# Altium footprint library PCB_IntegratedCircuit.PcbLib: 75 footprints (part 4 of 5)
Each footprint in its own frame and in the unit in brackets; x right, y up, seen from the top. Pads: shape width x height; smd on the part's side, far side on the other; paste and mask are expansions set on the pad; w line width, h text height; cw(c..) or ccw(c..) is an arc to the next point about the centre after c.
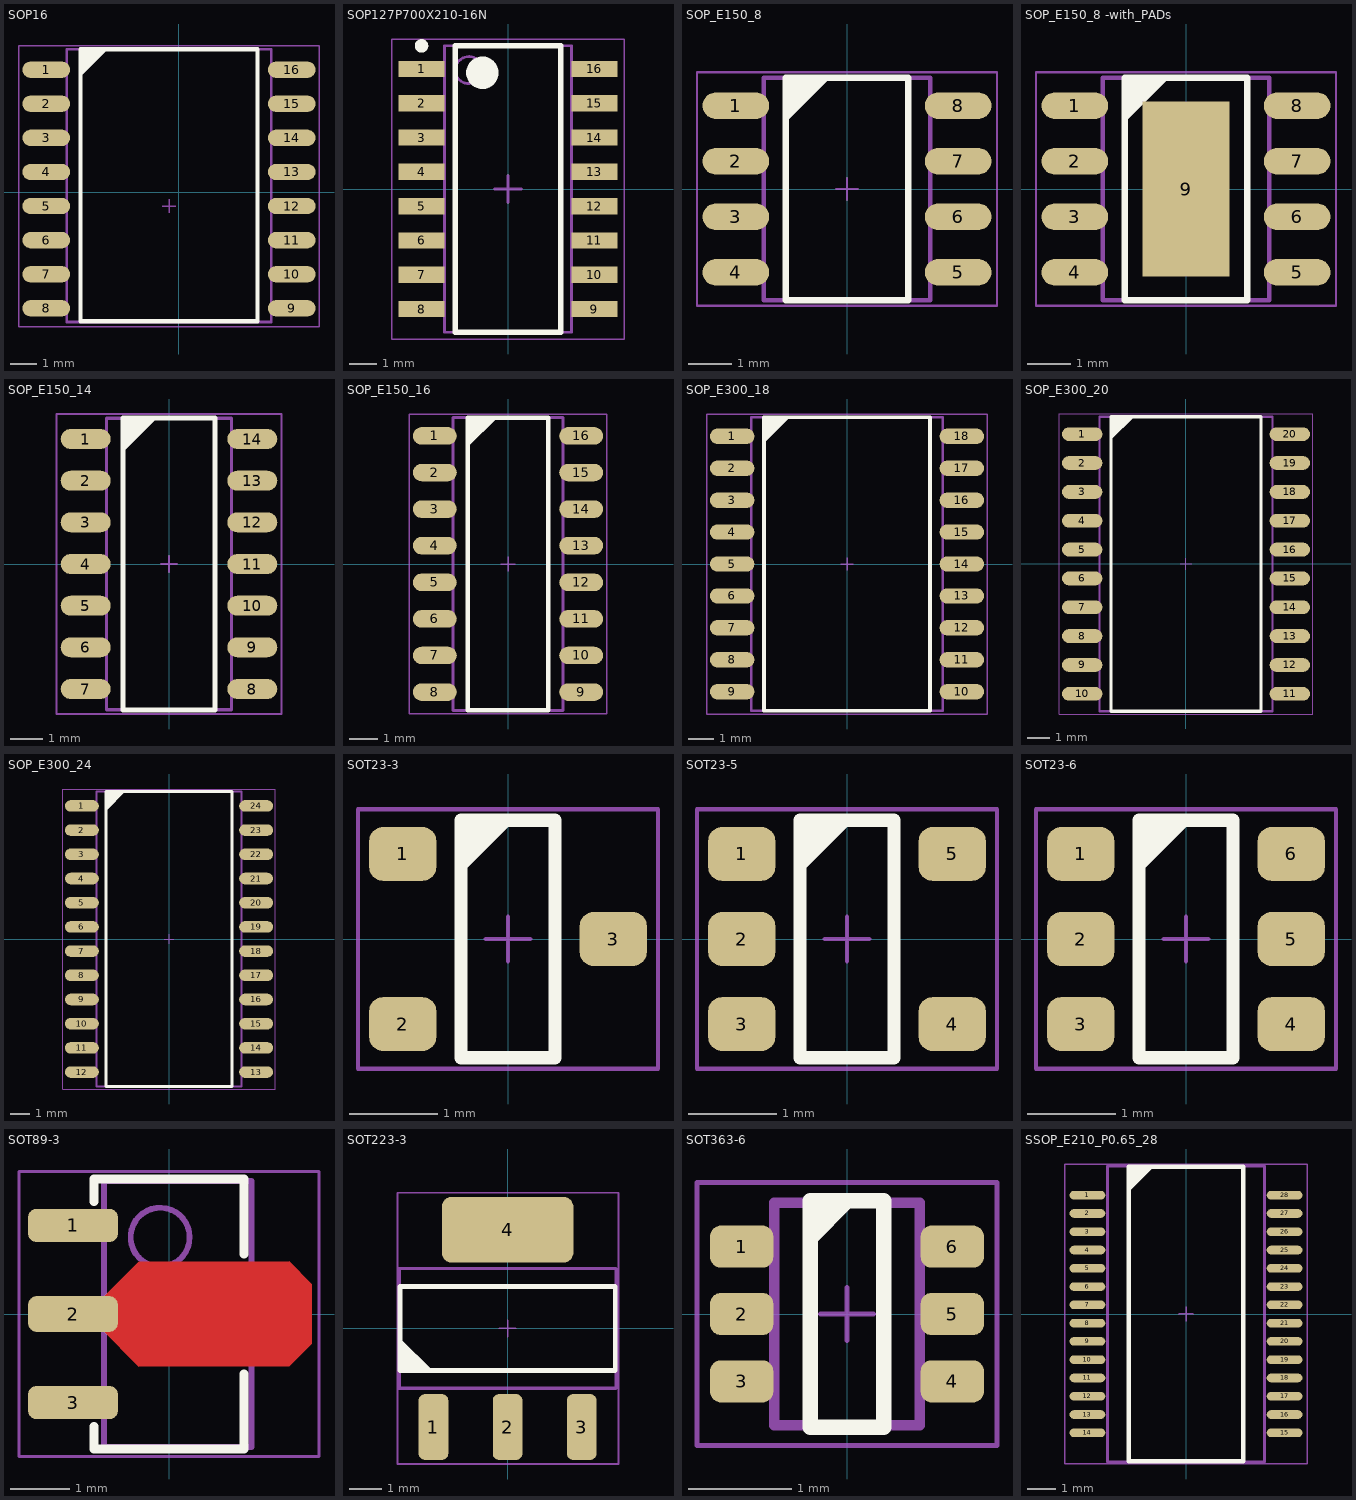
[diagram p3: the footprints below, top view; thin cyan lines are the x and y axes]

## SOP16 [mil]
pads (16):
  oval 70x24 smd: 1(-194,180) 2(-194,130) 3(-194,80) 4(-194,30) 5(-194,-20) 6(-194,-70) 7(-194,-120) 8(-194,-170) 9(166,-170) 10(166,-120) 11(166,-70) 12(166,-20) 13(166,30) 14(166,80) 15(166,130) 16(166,180)
Top Overlay:
  region: -144,210 -104,210 -144,170
  lines w6: -144,-189 -144,210 116,210 116,-189 -144,-189
Mechanical 13:
  lines w2: -24,-20 -4,-20 ; -14,-30 -14,-10
  lines w4: -164,-190 -164,210 136,210 136,-190 -164,-190
T-Component:
  lines w2: -234,-197 206,-197 206,215 -234,215 -234,-197
3D body "User Library-SOP16_208mil (5_3mm).STEP": height 70.87, standoff -7.87, extent -172.92,-195.78 138.93,205.79

## SOP127P700X210-16N [mm] "SOP, 16-Leads, Body 10.35x4.55mm, Pitch 1.27mm, IPC Medium Density"
height 2.1
pads (16):
  rect 1.7x0.6 smd: 1(-3.2,4.445) 2(-3.2,3.175) 3(-3.2,1.905) 4(-3.2,0.635) 5(-3.2,-0.635) 6(-3.2,-1.905) 7(-3.2,-3.175) 8(-3.2,-4.445) 9(3.2,-4.445) 10(3.2,-3.175) 11(3.2,-1.905) 12(3.2,-0.635) 13(3.2,0.635) 14(3.2,1.905) 15(3.2,3.175) 16(3.2,4.445)
Top Overlay:
  circle w0.6: c-0.95,4.3 r0.3
  circle w0.25: c-3.2,5.295 r0.125
  lines w0.2: -1.95,-5.3 1.95,-5.3 1.95,5.3 -1.95,5.3 -1.95,-5.3
Mechanical 13:
  circle w0.1: c-1.45,4.4 r0.5
  lines w0.1: -2.35,-5.3 2.35,-5.3 2.35,5.3 -2.35,5.3 -2.35,-5.3
B-Component:
  lines w0.05: -4.3,-5.55 4.3,-5.55 4.3,5.55 -4.3,5.55 -4.3,-5.55
  lines w0.1: -0.5,0 0.5,0 ; 0,-0.5 0,0.5
3D body "SOP127P700X210-16N.step": height 2.1, standoff 0, extent -3.5,-5.3 3.5,5.3

## SOP_E150_8 [mil]
height 68.9
pads (8):
  oval 60x24 smd: 1(-100,75) 2(-100,25) 3(-100,-25) 4(-100,-75) 5(100,-75) 6(100,-25) 7(100,25) 8(100,75)
Top Overlay:
  region: -55,100 -15,100 -55,60
  lines w6: -55,-100 55,-100 55,100 -55,100 -55,-100
Mechanical 13:
  lines w2: -10,0 10,0 ; 0,-10 0,10
  lines w4: -75,-100 -75,100 75,100 75,-100 -75,-100
T-Component:
  lines w2: -135,-105 135,-105 135,105 -135,105 -135,-105
3D body "User Library-SOIC-8-1.STEP": height 68.9, standoff 0, extent -118.1,-96.46 118.12,96.46

## SOP_E150_8 -with_PADs [mil]
height 68.9
pads (9):
  oval 60x24 smd: 1(-100,75) 2(-100,25) 3(-100,-25) 4(-100,-75) 5(100,-75) 6(100,-25) 7(100,25) 8(100,75)
  rect 78.74x157.48 smd: 9(0,0)
Top Overlay:
  region: -55,100 -15,100 -55,60
  lines w6: -55,-100 55,-100 55,100 -55,100 -55,-100
Mechanical 13:
  lines w2: -10,0 10,0 ; 0,-10 0,10
  lines w4: -75,-100 -75,100 75,100 75,-100 -75,-100
T-Component:
  lines w2: -135,-105 135,-105 135,105 -135,105 -135,-105
3D body "User Library-SOIC-8-1.STEP": height 68.9, standoff 0, extent -118.1,-96.46 118.12,96.46

## SOP_E150_14 [mil]
height 68.9
pads (14):
  oval 60x24 smd: 1(-100,150) 2(-100,100) 3(-100,50) 4(-100,0) 5(-100,-50) 6(-100,-100) 7(-100,-150) 8(100,-150) 9(100,-100) 10(100,-50) 11(100,0) 12(100,50) 13(100,100) 14(100,150)
Top Overlay:
  region: -55,175 -15,175 -55,135
  lines w6: -55,-175 -55,175 55,175 55,-175 -55,-175
Mechanical 13:
  lines w2: -10,0 10,0 ; 0,-10 0,10
  lines w4: -75,-175 75,-175 75,175 -75,175 -75,-175
T-Component:
  lines w2: -135,-180 -135,180 135,180 135,-180 -135,-180
3D body "User Library-SOIC-14.STEP": height 68.9, standoff 0, extent -118.1,-172.24 118.11,172.25

## SOP_E150_16 [mil]
height 68.9
pads (16):
  oval 60x24 smd: 1(-100,175) 2(-100,125) 3(-100,75) 4(-100,25) 5(-100,-25) 6(-100,-75) 7(-100,-125) 8(-100,-175) 9(100,-175) 10(100,-125) 11(100,-75) 12(100,-25) 13(100,25) 14(100,75) 15(100,125) 16(100,175)
Top Overlay:
  region: -55,200 -15,200 -55,160
  lines w6: -55,-200 -55,200 55,200 55,-200 -55,-200
Mechanical 13:
  lines w2: -10,0 10,0 ; 0,-10 0,10
  lines w4: -75,-200 75,-200 75,200 -75,200 -75,-200
T-Component:
  lines w2: -135,-205 -135,205 135,205 135,-205 -135,-205
3D body "User Library-SOIC-16-2.STEP": height 68.9, standoff 0, extent -118.1,-196.85 118.11,196.85

## SOP_E300_18 [mil]
height 104.33
pads (18):
  oval 70x24 smd: 1(-180,200) 2(-180,150) 3(-180,100) 4(-180,50) 5(-180,0) 6(-180,-50) 7(-180,-100) 8(-180,-150) 9(-180,-200) 10(180,-200) 11(180,-150) 12(180,-100) 13(180,-50) 14(180,0) 15(180,50) 16(180,100) 17(180,150) 18(180,200)
Top Overlay:
  region: -130,230 -90,230 -130,190
  lines w6: -130,-230 130,-230 130,230 -130,230 -130,-230
Mechanical 13:
  lines w2: -10,0 10,0 ; 0,-10 0,10
  lines w4: -150,-230 150,-230 150,230 -150,230 -150,-230
T-Component:
  lines w2: -220,-235 -220,235 220,235 220,-235 -220,-235
3D body "User Library-SOIC-18-300.STEP": height 101.26, standoff -1.1, extent -208.66,-231.29 208.66,231.31

## SOP_E300_20 [mil]
height 104.33
pads (20):
  oval 70x24 smd: 1(-180,225) 2(-180,175) 3(-180,125) 4(-180,75) 5(-180,25) 6(-180,-25) 7(-180,-75) 8(-180,-125) 9(-180,-175) 10(-180,-225) 11(180,-225) 12(180,-175) 13(180,-125) 14(180,-75) 15(180,-25) 16(180,25) 17(180,75) 18(180,125) 19(180,175) 20(180,225)
Top Overlay:
  region: -130,255 -90,255 -130,215
  lines w6: -130,-255 130,-255 130,255 -130,255 -130,-255
Mechanical 13:
  lines w2: -10,0 10,0 ; 0,-10 0,10
  lines w4: -150,-255 150,-255 150,255 -150,255 -150,-255
T-Component:
  lines w2: -220,-260 -220,260 220,260 220,-260 -220,-260
3D body "User Library-SOIC-20-300.STEP": height 101.26, standoff -1.1, extent -208.66,-255.9 208.66,255.91

## SOP_E300_24 [mil]
height 104.33
pads (24):
  oval 70x24 smd: 1(-180,275) 2(-180,225) 3(-180,175) 4(-180,125) 5(-180,75) 6(-180,25) 7(-180,-25) 8(-180,-75) 9(-180,-125) 10(-180,-175) 11(-180,-225) 12(-180,-275) 13(180,-275) 14(180,-225) 15(180,-175) 16(180,-125) 17(180,-75) 18(180,-25) 19(180,25) 20(180,75) 21(180,125) 22(180,175) 23(180,225) 24(180,275)
Top Overlay:
  region: -130,305 -90,305 -130,265
  lines w6: -130,-305 130,-305 130,305 -130,305 -130,-305
Mechanical 13:
  lines w2: -10,0 10,0 ; 0,-10 0,10
  lines w4: -150,-305 150,-305 150,305 -150,305 -150,-305
T-Component:
  lines w2: -220,-310 220,-310 220,310 -220,310 -220,-310
3D body "User Library-SOIC_24.STEP": height 102.36, standoff 0, extent -204.72,-308.46 204.73,297.84

## SOT23-3 [mil]
height 39.5
pads (3):
  rrect50% 30x24 smd: 1(-47,38) 2(-47,-38) 3(47,0)
Top Overlay:
  region: -21,53 3,53 -21,29
  lines w6: -21,-53 -21,53 21,53 21,-53 -21,-53
Mechanical 13:
  lines w2: -10,0 10,0 ; 0,-10 0,10
T-Component:
  lines w2: -67,-58 -67,58 67,58 67,-58 -67,-58
3D body "User Library-SOT23-3.STEP": height 51.18, standoff 0, extent -55.11,-57.09 55.12,57.09

## SOT23-5 [mil]
height 62.99
pads (5):
  rrect50% 30x24 smd: 1(-47,38) 2(-47,0) 3(-47,-38) 4(47,-38) 5(47,38)
Top Overlay:
  region: -21,53 3,53 -21,29
  lines w6: -21,-53 -21,53 21,53 21,-53 -21,-53
Mechanical 13:
  lines w2: -10,0 10,0 ; 0,-10 0,10
T-Component:
  lines w2: -67,-58 67,-58 67,58 -67,58 -67,-58
3D body "User Library-SOT23-5-2.STEP": height 57.09, standoff 0, extent -55.11,-57.09 55.12,57.09

## SOT23-6 [mil]
height 62.99
pads (6):
  rrect50% 30x24 smd: 1(-47,38) 2(-47,0) 3(-47,-38) 4(47,-38) 5(47,0) 6(47,38)
Top Overlay:
  region: -21,53 3,53 -21,29
  lines w6: -21,-53 21,-53 21,53 -21,53 -21,-53
Mechanical 13:
  lines w2: -10,0 10,0 ; 0,-10 0,10
T-Component:
  lines w2: -67,-58 67,-58 67,58 -67,58 -67,-58
3D body "User Library-SOT23-6-2.STEP": height 57.09, standoff 0, extent -55.11,-57.09 55.12,57.09

## SOT89-3 [mil]
height 59.06
pads (3):
  rrect50% 60x22 smd: 1(-64,59.06) 3(-64,-59.06)
  rrect50% 60x24 smd: 2(-64,0)
Top Layer:
  region: -45,10 -20,35 80,35 95,20 95,-20 80,-35 -20,-35 -45,-10
Top Overlay:
  lines w6: -50,-75 -50,-90 50,-90 50,-40 ; -50,75 -50,90 50,90 50,40
Mechanical 13:
  circle w3.94: c-5.91,51.18 r19.68
  lines w3.94: -13.78,0 25.59,0 ; 5.91,-19.69 5.91,19.68 ; -43.31,-88.58 55.12,-88.58 55.12,88.58 -43.31,88.58 -43.31,-88.58
T-Component:
  lines w2: -100,-95 100,-95 100,95 -100,95 -100,-95
3D body "SOT89-150P410X150-3N.step": height 60.06, standoff 1, extent -82.67,-88.44 74.81,88.45

## SOT223-3 [mil]
height 70.87
pads (4):
  rrect40% 36x80 smd: 1(-90.16,-120) 2(0,-120) 3(90.16,-120)
  rrect30% 160x80 smd: 4(0,120)
Top Overlay:
  region: -131,-51.18 -131,-11.81 -91.63,-51.18
  lines w6: -131,-51.18 131,-51.18 131,51.18 -131,51.18 -131,-51.18
Mechanical 13:
  lines w2: -10,0 10,0 ; 0,-10 0,10
  lines w3.94: -131.89,-72.83 131.89,-72.83 131.89,72.83 -131.89,72.83 -131.89,-72.83
T-Component:
  lines w2: -134,-165 135,-165 135,165 -134,165 -134,-165
3D body "SOT223-4.STEP": height 70.87, standoff 0, extent -131.88,-143.69 131.9,143.71

## SOT363-6 [mil]
height 43.31
pads (6):
  rrect50% 24x16 smd: 1(-40,25.59) 2(-40,0) 3(-40,-25.59) 4(40,-25.59) 5(40,0) 6(40,25.59)
Top Overlay:
  region: -14,43 0,43 -14,29
  lines w6: -14,29 0,43 ; -14,-43 14,-43 14,43 -14,43 -14,-43
Mechanical 13:
  lines w2: -10,0 10,0 ; 0,-10 0,10
  lines w4: -27.56,-42.32 27.56,-42.32 27.56,42.32 -27.56,42.32 -27.56,-42.32
T-Component:
  lines w2: -57,-50 57,-50 57,50 -57,50 -57,-50
3D body "SW3dPS-SC70-6.STEP": height 36.73, standoff -0.67, extent -41.33,-39.37 41.35,39.37

## SSOP_E210_P0.65_28 [mil]
height 78.74
pads (28):
  oval 50x12 smd: 1(-138,166.34) 2(-138,140.75) 3(-138,115.16) 4(-138,89.57) 5(-138,63.98) 6(-138,38.39) 7(-138,12.8) 8(-138,-12.8) 9(-138,-38.39) 10(-138,-63.98) 11(-138,-89.57) 12(-138,-115.16) 13(-138,-140.75) 14(-138,-166.34) 15(138,-166.34) 16(138,-140.75) 17(138,-115.16) 18(138,-89.57) 19(138,-63.98) 20(138,-38.39) 21(138,-12.8) 22(138,12.8) 23(138,38.39) 24(138,63.98) 25(138,89.57) 26(138,115.16) 27(138,140.75) 28(138,166.34)
Top Overlay:
  region: -80,206 -45,206 -80,171
  lines w6: -80,-206 80,-206 80,206 -80,206 -80,-206
Mechanical 13:
  lines w2: -10,0 10,0 ; 0,-10 0,10
  lines w4: -110,-207 110,-207 110,207 -110,207 -110,-207
T-Component:
  lines w2: -170,-210 170,-210 170,210 -170,210 -170,-210
3D body "User Library-SSOP-28-1.STEP": height 84.65, standoff 0, extent -152.66,-203.34 152.68,203.35